# Altium footprint library YQPOWER.PcbLib: 215 footprints (part 12 of 14)
Each footprint in its own frame and in the unit in brackets; x right, y up, seen from the top. Pads: shape width x height; smd on the part's side, far side on the other; paste and mask are expansions set on the pad; w line width, h text height; cw(c..) or ccw(c..) is an arc to the next point about the centre after c.
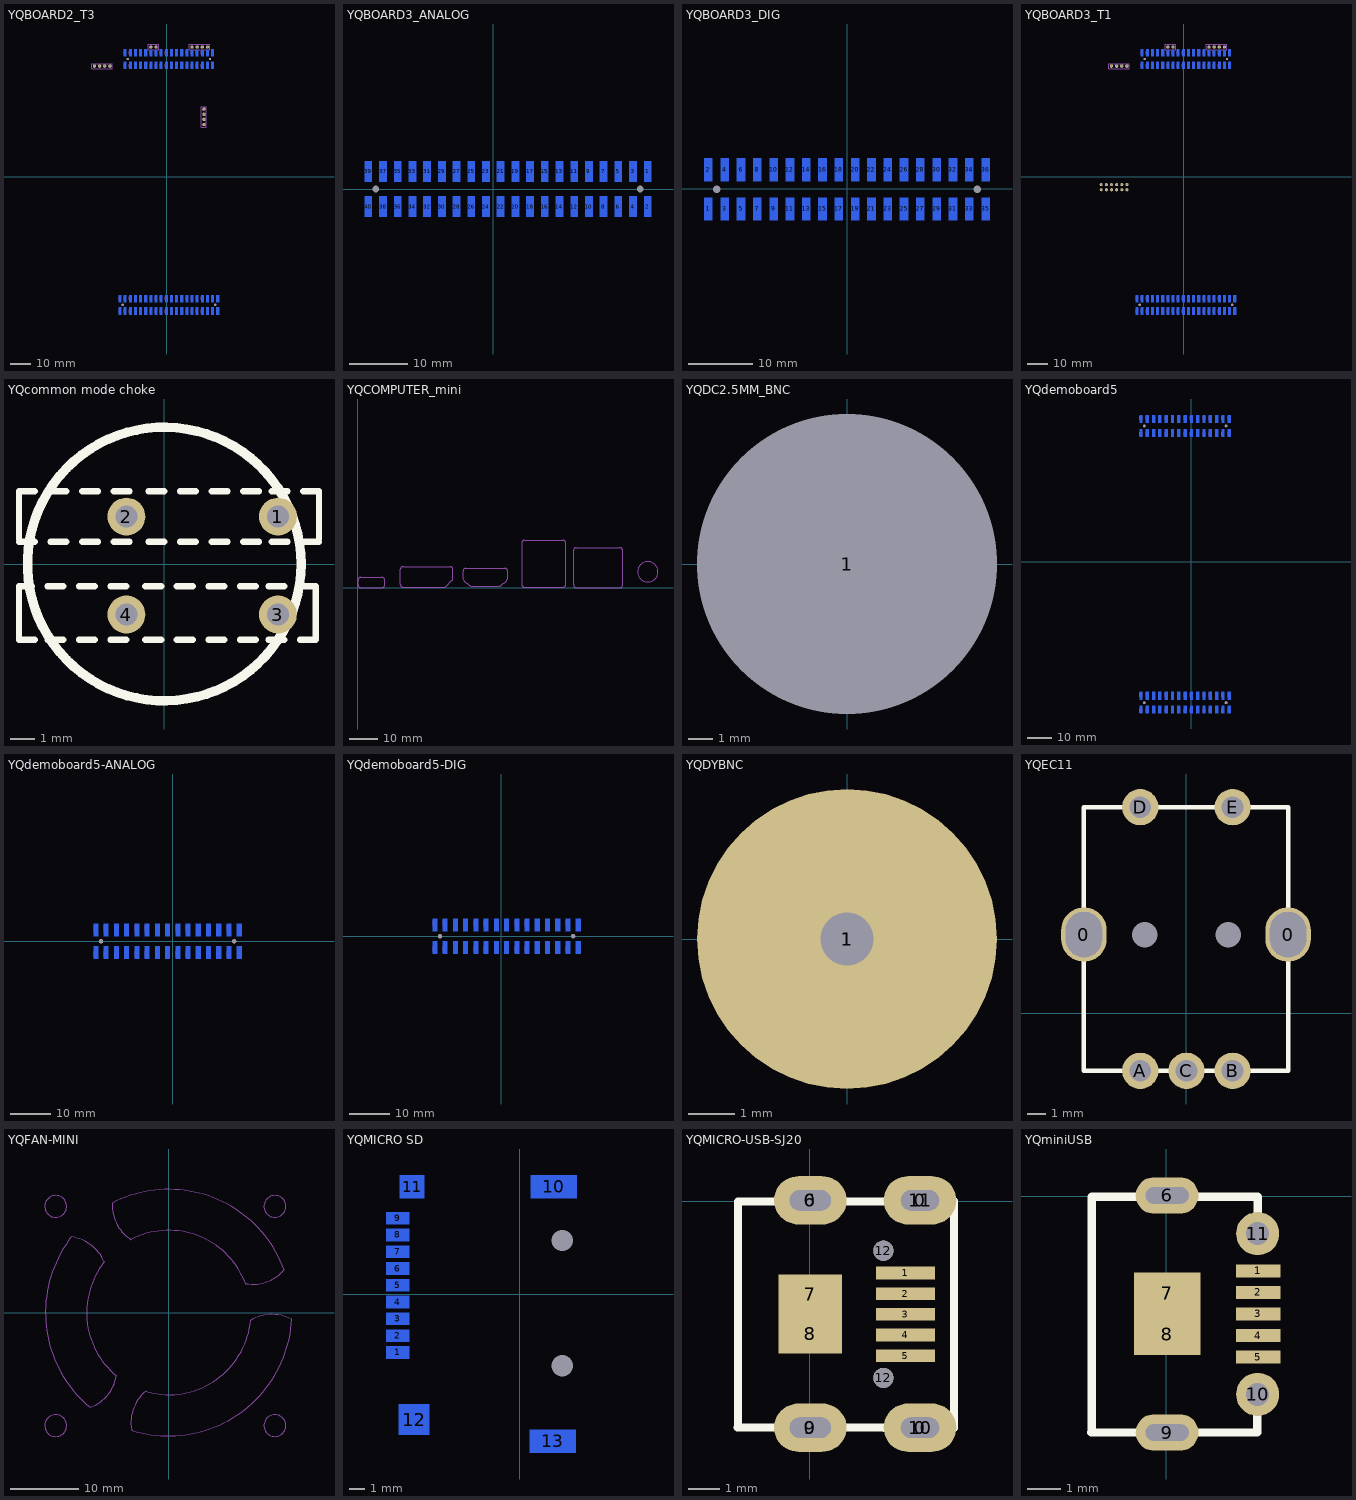
[diagram p11: the footprints below, top view; thin cyan lines are the x and y axes]

## YQBOARD2_T3 [mil]
pads (94):
  round 39.37 hole 45.28: 0(-855,-2495) 0(-755,2285) 0(845,2285) 0(945,-2495)
  rect 50x140 smd far side: 1(995,-2375) 2(995,-2615) 3(895,-2375) 4(895,-2615) 5(795,-2375) 6(795,-2615) 7(695,-2375) 8(695,-2615) 9(595,-2375) 10(595,-2615) 11(495,-2375) 12(495,-2615) 13(395,-2375) 14(395,-2615) 15(295,-2375) 16(295,-2615) 17(195,-2375) 18(195,-2615) 19(95,-2375) 20(95,-2615) 21(-5,-2375) 22(-5,-2615) 23(-105,-2375) 24(-105,-2615) 25(-205,-2375) 26(-205,-2615) 27(-305,-2375) 28(-305,-2615) 29(-405,-2375) 30(-405,-2615) 31(-505,-2375) 32(-505,-2615) 33(-605,-2375) 34(-605,-2615) 35(-705,-2375) 36(-705,-2615) 37(-805,-2375) 38(-805,-2615) 39(-905,-2375) 40(-905,-2615) 41(895,2405) 42(895,2165) 44(795,2165) 46(695,2165) 48(595,2165) 50(495,2165) 51(395,2405) 52(395,2165) 53(295,2405) 54(295,2165) 55(195,2405) 56(195,2165) 57(95,2405) 58(95,2165) 59(-5,2405) 60(-5,2165) 61(-105,2405) 62(-105,2165) 64(-205,2165) 66(-305,2165) 67(-405,2405) 68(-405,2165) 69(-505,2405) 70(-505,2165) 71(-605,2405) 72(-605,2165) 73(-705,2405) 74(-705,2165) 75(-805,2405) 76(-805,2165)
  rect 50x120 smd far side: 43(795,2395) 45(695,2395) 47(595,2395) 49(495,2395) 63(-205,2395) 65(-305,2395)
  round 64.96 hole 40 mask+0: 77(-1401.85,2147.91) 78(-1301.85,2147.91) 79(-1201.85,2147.91) 80(-1101.85,2147.91) 81(-304.8,2518.82) 82(-204.8,2518.82) 83(494.8,2517.99) 84(594.8,2517.99) 85(694.8,2517.99) 86(794.8,2517.99) 87(726.5,1011.69) 88(726.5,1111.69) 89(726.5,1211.69) 90(726.5,1311.69)
Bottom Overlay:
  region: 1061.5,-2318 1061.5,-2300 1028.5,-2300 1028.5,-2318
  lines w7: -1451.85,2097.91 -1051.85,2097.91 -1051.85,2197.91 -1451.85,2197.91 -1451.85,2097.91 ; -965,-2690 -965,-2300 1065,-2300 1065,-2690 -965,-2690 ; -875,2090 -875,2480 965,2480 965,2090 -875,2090 ; -354.8,2468.82 -354.8,2568.82 -154.8,2568.82 -154.8,2468.82 -354.8,2468.82 ; 444.8,2467.99 844.8,2467.99 844.8,2567.99 444.8,2567.99 444.8,2467.99 ; 676.5,961.69 676.5,1361.69 776.5,1361.69 776.5,961.69 676.5,961.69
  lines w10: -1723.31,-3003.66 -1723.31,2506.18 ; -1723.31,2507.16 cw(c-1623.31,2507.16) -1623.31,2607.16 ; -1722.91,-3001.1 ccw(c-1622.91,-3001.1) -1622.91,-3101.1 -1321.06,-3101.1 ; -1627.83,2607.56 1729.45,2607.56 ; -1123.98,-3100.87 -812.16,-3100.87 ; -615.31,-3100.87 -303.5,-3100.87 ; -106.65,-3100.87 205.16,-3100.87 ; 402.01,-3100.87 713.82,-3100.87 ; 910.67,-3100.87 1222.48,-3100.87 ; 1419.33,-3100.87 1719.84,-3100.87 ; 1720,-3100.71 ccw(c1720,-3000.71) 1820,-3000.71 ; 1730.96,2607.03 cw(c1730.96,2517.99) 1820,2517.99 1820,-3001.69
  lines w30: -1783.46,-2760.12 -1783.46,-3154.92 -1557.8,-3154.92 ; -1778.46,2280.12 -1778.46,2674.92 -1552.8,2674.92 ; 1647.8,-3159.92 1873.46,-3159.92 1873.46,-2765.12 ; 1652.8,2674.92 1878.46,2674.92 1878.46,2280.12
  text "1" at 1037,-2342 h40
  text "2" at 1030,-2615 h40
Mechanical 5:
  drawing of 244 lines, arcs and shapes, not listed
  text "1" at 1037,-2342 h40
  text "2" at 1025,-2617 h40

## YQBOARD3_ANALOG [mil]
pads (42):
  round 39.37 hole 45.28: 0(-800,0) 0(1000,0)
  rect 50x140 smd far side: 1(1050,120) 2(1050,-120) 3(950,120) 4(950,-120) 5(850,120) 6(850,-120) 7(750,120) 8(750,-120) 9(650,120) 10(650,-120) 11(550,120) 12(550,-120) 13(450,120) 14(450,-120) 15(350,120) 16(350,-120) 17(250,120) 18(250,-120) 19(150,120) 20(150,-120) 21(50,120) 22(50,-120) 23(-50,120) 24(-50,-120) 25(-150,120) 26(-150,-120) 27(-250,120) 28(-250,-120) 29(-350,120) 30(-350,-120) 31(-450,120) 32(-450,-120) 33(-550,120) 34(-550,-120) 35(-650,120) 36(-650,-120) 37(-750,120) 38(-750,-120) 39(-850,120) 40(-850,-120)
Bottom Overlay:
  region: 1116.5,177 1116.5,195 1083.5,195 1083.5,177
  lines w7: -910,-195 1120,-195 1120,195 -910,195 -910,-195
  text "2" at 1085,-120 h40
  text "1" at 1092,153 h40
Mechanical 5:
  lines w5: -866,-97.5 -866,-155 -834,-155 -834,-97.5 ; -866,97.5 -866,155 -834,155 -834,97.5 ; -766,-97.5 -766,-155 -734,-155 -734,-97.5 ; -766,97.5 -766,155 -734,155 -734,97.5 ; -666,-97.5 -666,-155 -634,-155 -634,-97.5 ; -666,97.5 -666,155 -634,155 -634,97.5 ; -566,-97.5 -566,-155 -534,-155 -534,-97.5 ; -566,97.5 -566,155 -534,155 -534,97.5 ; -466,-97.5 -466,-155 -434,-155 -434,-97.5 ; -466,97.5 -466,155 -434,155 -434,97.5 ; -366,-97.5 -366,-155 -334,-155 -334,-97.5 ; -366,97.5 -366,155 -334,155 -334,97.5 ; -266,-97.5 -266,-155 -234,-155 -234,-97.5 ; -266,97.5 -266,155 -234,155 -234,97.5 ; -166,-97.5 -166,-155 -134,-155 -134,-97.5 ; -166,97.5 -166,155 -134,155 -134,97.5 ; -66,-97.5 -66,-155 -34,-155 -34,-97.5 ; -66,97.5 -66,155 -34,155 -34,97.5 ; 34,-97.5 34,-155 66,-155 66,-97.5 ; 34,97.5 34,155 66,155 66,97.5 ; 134,-97.5 134,-155 166,-155 166,-97.5 ; 134,97.5 134,155 166,155 166,97.5 ; 234,-97.5 234,-155 266,-155 266,-97.5 ; 234,97.5 234,155 266,155 266,97.5 ; 334,-97.5 334,-155 366,-155 366,-97.5 ; 334,97.5 334,155 366,155 366,97.5 ; 434,-97.5 434,-155 466,-155 466,-97.5 ; 434,97.5 434,155 466,155 466,97.5 ; 534,-97.5 534,-155 566,-155 566,-97.5 ; 534,97.5 534,155 566,155 566,97.5 ; 634,-97.5 634,-155 666,-155 666,-97.5 ; 634,97.5 634,155 666,155 666,97.5 ; 734,-97.5 734,-155 766,-155 766,-97.5 ; 734,97.5 734,155 766,155 766,97.5 ; 834,-97.5 834,-155 866,-155 866,-97.5 ; 834,97.5 834,155 866,155 866,97.5 ; 934,-97.5 934,-155 966,-155 966,-97.5 ; 934,97.5 934,155 966,155 966,97.5 ; 1034,-97.5 1034,-155 1066,-155 1066,-97.5 ; 1034,97.5 1034,155 1066,155 1066,97.5
  text "2" at 1080,-122 h40
  text "1" at 1092,153 h40

## YQBOARD3_DIG [mil]
pads (38):
  round 39.37 hole 45.28: 0(-800,-5) 0(800,-5)
  rect 50x140 smd far side: 1(-850,-125) 2(-850,115) 3(-750,-125) 4(-750,115) 5(-650,-125) 6(-650,115) 7(-550,-125) 8(-550,115) 9(-450,-125) 10(-450,115) 11(-350,-125) 12(-350,115) 13(-250,-125) 14(-250,115) 15(-150,-125) 16(-150,115) 17(-50,-125) 18(-50,115) 19(50,-125) 20(50,115) 21(150,-125) 22(150,115) 23(250,-125) 24(250,115) 25(350,-125) 26(350,115) 27(450,-125) 28(450,115) 29(550,-125) 30(550,115) 31(650,-125) 32(650,115) 33(750,-125) 34(750,115) 35(850,-125) 36(850,115)
Bottom Overlay:
  lines w7: -920,190 -920,-200 920,-200 920,195
  lines w8: -920,190 -915,195 920,195
Mechanical 5:
  lines w5: -866,-102.5 -866,-160 -834,-160 -834,-102.5 ; -766,-102.5 -766,-160 -734,-160 -734,-102.5 ; -666,-102.5 -666,-160 -634,-160 -634,-102.5 ; -566,-102.5 -566,-160 -534,-160 -534,-102.5 ; -466,-102.5 -466,-160 -434,-160 -434,-102.5 ; -366,-102.5 -366,-160 -334,-160 -334,-102.5 ; -266,-102.5 -266,-160 -234,-160 -234,-102.5 ; -166,-102.5 -166,-160 -134,-160 -134,-102.5 ; -66,-102.5 -66,-160 -34,-160 -34,-102.5 ; 34,-102.5 34,-160 66,-160 66,-102.5 ; 134,-102.5 134,-160 166,-160 166,-102.5 ; 234,-102.5 234,-160 266,-160 266,-102.5 ; 334,-102.5 334,-160 366,-160 366,-102.5 ; 434,-102.5 434,-160 466,-160 466,-102.5 ; 534,-102.5 534,-160 566,-160 566,-102.5 ; 634,-102.5 634,-160 666,-160 666,-102.5 ; 734,-102.5 734,-160 766,-160 766,-102.5 ; 834,-102.5 834,-160 866,-160 866,-102.5

## YQBOARD3_T1 [mil]
pads (102):
  round 39.37 hole 45.28: 0(-855,-2495) 0(-755,2285) 0(845,2285) 0(945,-2495)
  rect 50x140 smd far side: 1(995,-2375) 2(995,-2615) 3(895,-2375) 4(895,-2615) 5(795,-2375) 6(795,-2615) 7(695,-2375) 8(695,-2615) 9(595,-2375) 10(595,-2615) 11(495,-2375) 12(495,-2615) 13(395,-2375) 14(395,-2615) 15(295,-2375) 16(295,-2615) 17(195,-2375) 18(195,-2615) 19(95,-2375) 20(95,-2615) 21(-5,-2375) 22(-5,-2615) 23(-105,-2375) 24(-105,-2615) 25(-205,-2375) 26(-205,-2615) 27(-305,-2375) 28(-305,-2615) 29(-405,-2375) 30(-405,-2615) 31(-505,-2375) 32(-505,-2615) 33(-605,-2375) 34(-605,-2615) 35(-705,-2375) 36(-705,-2615) 37(-805,-2375) 38(-805,-2615) 39(-905,-2375) 40(-905,-2615) 41(895,2405) 42(895,2165) 44(795,2165) 46(695,2165) 48(595,2165) 50(495,2165) 51(395,2405) 52(395,2165) 53(295,2405) 54(295,2165) 55(195,2405) 56(195,2165) 57(95,2405) 58(95,2165) 59(-5,2405) 60(-5,2165) 61(-105,2405) 62(-105,2165) 64(-205,2165) 66(-305,2165) 67(-405,2405) 68(-405,2165) 69(-505,2405) 70(-505,2165) 71(-605,2405) 72(-605,2165) 73(-705,2405) 74(-705,2165) 75(-805,2405) 76(-805,2165)
  rect 50x120 smd far side: 43(795,2395) 45(695,2395) 47(595,2395) 49(495,2395) 63(-205,2395) 65(-305,2395)
  round 64.96 hole 40 mask+0: 77(-1401.85,2147.91) 78(-1301.85,2147.91) 79(-1201.85,2147.91) 80(-1101.85,2147.91) 81(-304.8,2518.82) 82(-204.8,2518.82) 83(494.8,2517.99) 84(594.8,2517.99) 85(694.8,2517.99) 86(794.8,2517.99)
  round 59.06 hole 35.43: 91(-1601.26,-257.21) 92(-1501.26,-257.21) 93(-1401.26,-257.21) 94(-1301.26,-257.21) 95(-1201.26,-257.21) 96(-1101.26,-257.21) 97(-1101.26,-157.21) 98(-1201.26,-157.21) 99(-1301.26,-157.21) 100(-1401.26,-157.21) 101(-1501.26,-157.21) 102(-1601.26,-157.21)
Bottom Overlay:
  region: 1061.5,-2318 1061.5,-2300 1028.5,-2300 1028.5,-2318
  lines w7: -1451.85,2097.91 -1051.85,2097.91 -1051.85,2197.91 -1451.85,2197.91 -1451.85,2097.91 ; -965,-2690 -965,-2300 1065,-2300 1065,-2690 -965,-2690 ; -875,2090 -875,2480 965,2480 965,2090 -875,2090 ; -354.8,2468.82 -354.8,2568.82 -154.8,2568.82 -154.8,2468.82 -354.8,2468.82 ; 444.8,2467.99 844.8,2467.99 844.8,2567.99 444.8,2567.99 444.8,2467.99
  lines w7.87: -1651.26,-307.21 -1051.26,-307.21 -1051.26,-107.21 -1651.26,-107.21 -1651.26,-307.21
  lines w10: -1723.31,-3003.66 -1723.31,2506.18 ; -1723.31,2507.16 cw(c-1623.31,2507.16) -1623.31,2607.16 ; -1722.91,-3001.1 ccw(c-1622.91,-3001.1) -1622.91,-3101.1 -1321.06,-3101.1 ; -1627.83,2607.56 1729.45,2607.56 ; -1123.98,-3100.87 -812.16,-3100.87 ; -615.31,-3100.87 -303.5,-3100.87 ; -106.65,-3100.87 205.16,-3100.87 ; 402.01,-3100.87 713.82,-3100.87 ; 910.67,-3100.87 1222.48,-3100.87 ; 1419.33,-3100.87 1719.84,-3100.87 ; 1720,-3100.71 ccw(c1720,-3000.71) 1820,-3000.71 ; 1730.96,2607.03 cw(c1730.96,2517.99) 1820,2517.99 1820,-3001.69
  lines w30: -1783.46,-2760.12 -1783.46,-3154.92 -1557.8,-3154.92 ; -1778.46,2280.12 -1778.46,2674.92 -1552.8,2674.92 ; 1647.8,-3159.92 1873.46,-3159.92 1873.46,-2765.12 ; 1652.8,2674.92 1878.46,2674.92 1878.46,2280.12
  text "1" at 1037,-2342 h40
  text "2" at 1030,-2615 h40
Mechanical 5:
  drawing of 240 lines, arcs and shapes, not listed
  text "1" at 1037,-2342 h40
  text "2" at 1025,-2617 h40

## YQcommon mode choke [mil]
pads (4):
  round 60 hole 35: 1(180,75) 2(-60,75) 3(180,-80) 4(-60,-80)
Top Overlay:
  circle w15: c0,0 r216.54
  lines w10: -230,-70 -230,-45 ; -230,35 -205,35 ; -230,40 -230,115 ; -230,90 -230,115 ; -210,-35 -230,-35 -230,-120 -205,-120 ; -205,115 -230,115 ; -185,-120 -160,-120 ; -185,-35 -160,-35 ; -180,35 -155,35 ; -180,115 -155,115 ; -135,-120 -110,-120 ; -135,-35 -110,-35 ; -130,35 -105,35 ; -130,115 -105,115 ; -85,-120 -60,-120 ; -85,-35 -60,-35 ; -80,35 -55,35 ; -80,115 -55,115 ; -30,-120 -5,-120 ; -30,-35 -5,-35 ; -25,35 0,35 ; -25,115 0,115 ; 20,-120 45,-120 ; 20,-35 45,-35 ; 25,35 50,35 ; 25,115 50,115 ; 70,-120 95,-120 ; 70,-35 95,-35 ; 75,35 100,35 ; 75,115 100,115 ; 120,-120 145,-120 ; 120,-35 145,-35 ; 125,35 150,35 ; 125,115 150,115 ; 165,-120 190,-120 ; 165,-35 190,-35 ; 170,35 195,35 ; 170,115 195,115 ; 215,-120 240,-120 240,-35 215,-35 ; 220,35 245,35 ; 220,115 245,115 245,40 245,65 ; 240,-110 240,-85

## YQCOMPUTER_mini [mm]
Mechanical 1:
  lines w0.1: 0.006,2.7 cw(c1.006,2.7) 1.01,3.7 8.412,3.7 cw(c8.415,2.7) 9.415,2.7 9.415,1 cw(c8.415,1) 8.412,0 1.01,0 ; 0.01,2.709 0.01,1.008 ccw(c1.01,1.005) 1.01,0.005 ; 33.483,3.311 cw(c32.483,3.307) 33.18,2.59 31.08,0.49 cw(c30.376,1.2) 30.376,0.2 15.98,0.2 cw(c15.976,1.2) 14.976,1.2 14.976,6.5 cw(c15.976,6.5) 15.98,7.5 32.48,7.5 cw(c32.484,6.5) 33.484,6.5 33.484,3.3 ; 37.076,5.9 cw(c38.076,5.9) 38.08,6.9 51.78,6.9 cw(c51.784,5.9) 52.784,5.9 ; 37.08,5.9 37.08,3.19 ccw(c39.478,3.897) 38.59,1.56 39.268,0.892 ; 39.266,0.89 ccw(c39.97,1.6) 39.97,0.6 49.89,0.6 ; 49.89,0.6 ccw(c49.89,1.6) 50.594,0.891 ; 50.592,0.893 51.27,1.56 ccw(c50.382,3.898) 52.78,3.19 52.78,5.9 ; 100.848,2.351 cw(c102.281,5.653) 100.85,2.35 ; 57.79,1.21 ccw(c58.79,1.206) 58.79,0.206 72.29,0.206 ccw(c72.29,1.206) 73.29,1.21 73.29,15.81 ccw(c72.29,15.814) 72.29,16.814 58.79,16.814 ccw(c58.79,15.814) 57.79,15.81 57.79,1.21 ; 76.08,1 ccw(c77.08,0.996) 77.08,-0.004 92.38,-0.004 ccw(c92.38,0.996) 93.38,1 93.38,13.2 ccw(c92.38,13.204) 92.38,14.204 77.08,14.204 ccw(c77.08,13.204) 76.08,13.2 76.08,1

## YQDC2.5MM_BNC [mm] "5mm high,5mm D,1mm hole"
pads (1):
  round 2 hole 12.5: 1(0,0)

## YQdemoboard5 [mil]
pads (64):
  round 39.37 hole 43.31: 0(-745,-2240) 0(-745,2150) 0(555,-2240) 0(555,2150)
  rect 45x120 smd far side: 1(605,-2350) 2(605,-2130) 3(505,-2350) 4(505,-2130) 5(405,-2350) 6(405,-2130) 7(305,-2350) 8(305,-2130) 9(205,-2350) 10(205,-2130) 11(105,-2350) 12(105,-2130) 13(5,-2350) 14(5,-2130) 15(-95,-2350) 16(-95,-2130) 17(-195,-2350) 18(-195,-2130) 19(-295,-2350) 20(-295,-2130) 21(-395,-2350) 22(-395,-2130) 23(-495,-2350) 24(-495,-2130) 25(-595,-2350) 26(-595,-2130) 27(-695,-2350) 28(-695,-2130) 29(-795,-2350) 30(-795,-2130) 31(605,2040) 32(605,2260) 33(505,2040) 34(505,2260) 35(405,2040) 36(405,2260) 37(305,2040) 38(305,2260) 39(205,2040) 40(205,2260) 41(105,2040) 42(105,2260) 43(5,2040) 44(5,2260) 45(-95,2040) 46(-95,2260) 47(-195,2040) 48(-195,2260) 49(-295,2040) 50(-295,2260) 51(-395,2040) 52(-395,2260) 53(-495,2040) 54(-495,2260) 55(-595,2040) 56(-595,2260) 57(-695,2040) 58(-695,2260) 59(-795,2040) 60(-795,2260)
Bottom Overlay:
  region: 673,-2080 673,-2062 640,-2062 640,-2080
  region: 673,2310 673,2328 640,2328 640,2310
  lines w7: -865,-2418 -865,-2062 -363,-2062 -362,-2061 673,-2061 673,-2419 -362,-2419 -363,-2418 -865,-2418 ; -865,1972 -865,2328 -363,2328 -362,2329 673,2329 673,1971 -362,1971 -363,1972 -865,1972
  lines w10: -1209.35,2142.44 -1209.98,2143.07 -1254.62,2143.07 -1254.62,2339.92 -1253.99,2339.29 -974.62,2339.29 -974.62,2142.44 -1018.4,2142.44
  lines w30: -1545.67,-2014.88 -1545.67,-2410.55 -1312.2,-2410.55 ; -1545.67,1915.12 -1545.67,2309.92 -1180,2310 ; 905,-2415 1375,-2415 ; 1157.8,2309.92 1383.46,2309.92 1383.46,1915.12 ; 1383.46,-2410.55 1383.46,-2014.88
  text "1" at 647,-2087 h40
  text "2" at 635,-2362 h40
  text "1" at 647,2303 h40
  text "2" at 635,2028 h40
Mechanical 5:
  drawing of 180 lines, arcs and shapes, not listed
  text "1" at 647,-2087 h40
  text "2" at 635,-2362 h40
  text "1" at 647,2303 h40
  text "2" at 635,2028 h40

## YQdemoboard5-ANALOG [mil]
pads (32):
  round 39.37 hole 43.31: 0(-700,0) 0(600,0)
  rect 45x120 smd far side: 1(650,-110) 2(650,110) 3(550,-110) 4(550,110) 5(450,-110) 6(450,110) 7(350,-110) 8(350,110) 9(250,-110) 10(250,110) 11(150,-110) 12(150,110) 13(50,-110) 14(50,110) 15(-50,-110) 16(-50,110) 17(-150,-110) 18(-150,110) 19(-250,-110) 20(-250,110) 21(-350,-110) 22(-350,110) 23(-450,-110) 24(-450,110) 25(-550,-110) 26(-550,110) 27(-650,-110) 28(-650,110) 29(-750,-110) 30(-750,110)
Bottom Overlay:
  region: 718,160 718,178 685,178 685,160
  lines w7: -820,-178 -820,178 -318,178 -317,179 718,179 718,-179 -317,-179 -318,-178 -820,-178
  lines w30: -1500.67,225.12 -1500.67,-170.55 -1267.2,-170.55 ; 950,-175 1420,-175 ; 1428.46,-170.55 1428.46,225.12
  text "1" at 692,153 h40
  text "2" at 680,-122 h40
Mechanical 5:
  lines w5: -766,-97.5 -766,-155 -734,-155 -734,-97.5 ; -766,97.5 -766,155 -734,155 -734,97.5 ; -666,-97.5 -666,-155 -634,-155 -634,-97.5 ; -666,97.5 -666,155 -634,155 -634,97.5 ; -566,-97.5 -566,-155 -534,-155 -534,-97.5 ; -566,97.5 -566,155 -534,155 -534,97.5 ; -466,-97.5 -466,-155 -434,-155 -434,-97.5 ; -466,97.5 -466,155 -434,155 -434,97.5 ; -366,-97.5 -366,-155 -334,-155 -334,-97.5 ; -366,97.5 -366,155 -334,155 -334,97.5 ; -266,-97.5 -266,-155 -234,-155 -234,-97.5 ; -266,97.5 -266,155 -234,155 -234,97.5 ; -166,-97.5 -166,-155 -134,-155 -134,-97.5 ; -166,97.5 -166,155 -134,155 -134,97.5 ; -66,-97.5 -66,-155 -34,-155 -34,-97.5 ; -66,97.5 -66,155 -34,155 -34,97.5 ; 34,-97.5 34,-155 66,-155 66,-97.5 ; 34,97.5 34,155 66,155 66,97.5 ; 134,-97.5 134,-155 166,-155 166,-97.5 ; 134,97.5 134,155 166,155 166,97.5 ; 234,-97.5 234,-155 266,-155 266,-97.5 ; 234,97.5 234,155 266,155 266,97.5 ; 334,-97.5 334,-155 366,-155 366,-97.5 ; 334,97.5 334,155 366,155 366,97.5 ; 434,-97.5 434,-155 466,-155 466,-97.5 ; 434,97.5 434,155 466,155 466,97.5 ; 534,-97.5 534,-155 566,-155 566,-97.5 ; 534,97.5 534,155 566,155 566,97.5 ; 634,-97.5 634,-155 666,-155 666,-97.5 ; 634,97.5 634,155 666,155 666,97.5
  text "1" at 692,153 h40
  text "2" at 680,-122 h40

## YQdemoboard5-DIG [mil]
pads (32):
  round 39.37 hole 43.31: 0(-600,0) 0(700,0)
  rect 45x120 smd far side: 31(750,-110) 32(750,110) 33(650,-110) 34(650,110) 35(550,-110) 36(550,110) 37(450,-110) 38(450,110) 39(350,-110) 40(350,110) 41(250,-110) 42(250,110) 43(150,-110) 44(150,110) 45(50,-110) 46(50,110) 47(-50,-110) 48(-50,110) 49(-150,-110) 50(-150,110) 51(-250,-110) 52(-250,110) 53(-350,-110) 54(-350,110) 55(-450,-110) 56(-450,110) 57(-550,-110) 58(-550,110) 59(-650,-110) 60(-650,110)
Bottom Overlay:
  region: 818,160 818,178 785,178 785,160
  lines w7: -720,-178 -218,-178 -217,-179 818,-179 818,179 -217,179 -218,178 -720,178 -720,-178
  lines w30: -1400.67,-234.88 -1400.67,159.92 -1035,160 ; 1302.8,159.92 1528.46,159.92 1528.46,-234.88
  text "2" at 780,-122 h40
  text "1" at 792,153 h40
Mechanical 5:
  lines w5: -666,-97.5 -666,-155 -634,-155 -634,-97.5 ; -666,97.5 -666,155 -634,155 -634,97.5 ; -566,-97.5 -566,-155 -534,-155 -534,-97.5 ; -566,97.5 -566,155 -534,155 -534,97.5 ; -466,-97.5 -466,-155 -434,-155 -434,-97.5 ; -466,97.5 -466,155 -434,155 -434,97.5 ; -366,-97.5 -366,-155 -334,-155 -334,-97.5 ; -366,97.5 -366,155 -334,155 -334,97.5 ; -266,-97.5 -266,-155 -234,-155 -234,-97.5 ; -266,97.5 -266,155 -234,155 -234,97.5 ; -166,-97.5 -166,-155 -134,-155 -134,-97.5 ; -166,97.5 -166,155 -134,155 -134,97.5 ; -66,-97.5 -66,-155 -34,-155 -34,-97.5 ; -66,97.5 -66,155 -34,155 -34,97.5 ; 34,-97.5 34,-155 66,-155 66,-97.5 ; 34,97.5 34,155 66,155 66,97.5 ; 134,-97.5 134,-155 166,-155 166,-97.5 ; 134,97.5 134,155 166,155 166,97.5 ; 234,-97.5 234,-155 266,-155 266,-97.5 ; 234,97.5 234,155 266,155 266,97.5 ; 334,-97.5 334,-155 366,-155 366,-97.5 ; 334,97.5 334,155 366,155 366,97.5 ; 434,-97.5 434,-155 466,-155 466,-97.5 ; 434,97.5 434,155 466,155 466,97.5 ; 534,-97.5 534,-155 566,-155 566,-97.5 ; 534,97.5 534,155 566,155 566,97.5 ; 634,-97.5 634,-155 666,-155 666,-97.5 ; 634,97.5 634,155 666,155 666,97.5 ; 734,-97.5 734,-155 766,-155 766,-97.5 ; 734,97.5 734,155 766,155 766,97.5
  text "2" at 780,-122 h40
  text "1" at 792,153 h40

## YQDYBNC [mm] "5mm high,5mm D,1mm hole"
pads (2):
  round 2 hole 1.15: 1(0,0)
  round 6.5 smd: 1(0,0)

## YQEC11 [mm]
pads (9):
  oval 2.5x3 hole 2 slot 2.5 at 90 deg: 0(-5.639,4.318) 0(5.588,4.318)
  round 0 hole 1.4: 0(-2.286,4.318) 0(2.286,4.318)
  round 2 hole 1.2: A(-2.54,-3.175) B(2.54,-3.175) C(0,-3.175) D(-2.54,11.325) E(2.54,11.325)
Top Overlay:
  lines w0.254: -5.639,-3.175 5.588,-3.175 5.588,11.325 -5.639,11.325 -5.639,-3.175

## YQFAN-MINI [mm]
Mechanical 1:
  lines w0.1: -15,-15.943 ccw(c-16.5,-16.5) -14.996,-15.955 ; -15,16.057 ccw(c-16.5,15.5) -14.996,16.045 ; -14.22,11.05 cw(c-14.985,5.099) -9.436,7.382 ; -14.218,11.049 ccw(c0,0.01) -11.482,-13.852 ; -11.465,-13.854 ccw(c-13.56,-8.231) -7.649,-9.261 ; -9.439,7.387 ccw(c0.01,-0.01) -7.638,-9.257 ; -8.255,15.985 cw(c0,-0.01) 16.873,6.259 ; -8.25,15.99 ccw(c-2.257,15.693) -5.516,10.655 ; -5.524,10.668 cw(c-0.01,0.01) 11.223,4.23 ; -5.435,-17.161 cw(c0.472,-16.107) -3.382,-11.508 ; -5.428,-17.165 ccw(c-0.01,0) 17.962,-1.01 ; -3.379,-11.502 ccw(c0.01,0.01) 11.955,-1.138 ; 11.22,4.24 ccw(c12.314,10.139) 16.882,6.249 ; 11.95,-1.13 cw(c15.061,-6.26) 17.955,-1.004 ; 17,-15.943 ccw(c15.5,-16.5) 17.004,-15.955 ; 17,16.057 ccw(c15.5,15.5) 17.004,16.045

## YQMICRO SD [mm]
pads (15):
  round 0 hole 1.4 mask+0: 0(2.794,-4.669) 0(2.794,3.531)
  rect 1.5x0.8 smd far side: 1(-7.982,-3.805) 2(-7.982,-2.705) 3(-7.982,-1.605) 4(-7.982,-0.505) 5(-7.982,0.595) 6(-7.982,1.695) 7(-7.982,2.795) 8(-7.982,3.895) 9(-7.982,4.995)
  rect 3x1.5 smd far side: 10(2.234,7.043) 13(2.18,-9.612)
  rect 1.6x1.5 smd far side: 11(-7.037,7.043)
  rect 2x2 smd far side: 12(-6.91,-8.197)
Bottom Overlay:
  lines w0.254: 7.21,-8.651 7.21,6.027 -6.91,6.027 -6.91,-6.8 -5.005,-6.8 -5.005,-8.578 7.21,-8.578

## YQMICRO-USB-SJ20 [mil] "MICRO-USB-SJ20"
pads (17):
  oval 90x60 on Top Paste: 0(1,-280.5) 0(1,1) 0(136.81,-280.5) 0(136.81,1)
  rect 72.83x15.75 smd: 1(118.72,-88.96) 2(118.72,-114.55) 3(118.72,-140.14) 4(118.72,-165.73) 5(118.72,-191.32)
  oval 90x60 hole 25.59 slot 51.18 at 0 deg: 6(1,1) 9(1,-280.5)
  rect 78.74x49.21 smd: 7(1,-115.14) 8(1,-164)
  oval 90x60 hole 25.59 slot 47.24 at 0 deg: 10(136.81,-280.5) 11(136.81,1)
  round 25 hole 25: 12(91.54,-218.9) 12(91.54,-61.42)
Top Overlay:
  lines w10: 92.91,-281.1 178.74,-281.1 178.74,0 100.79,0 ; 107.85,-280.5 -89,-280.5 -88.37,-279.87 -88.37,-0.5 108.48,-0.5

## YQminiUSB [mm]
pads (11):
  rect 1.35x0.4 smd: 1(2.775,-2.25) 2(2.775,-2.9) 3(2.775,-3.55) 4(2.775,-4.2) 5(2.775,-4.85)
  oval 1.9x1.1 hole 0.5 slot 1.3 at 0 deg: 6(0.025,0.025) 9(0.025,-7.125)
  rect 2x1.25 smd: 7(0.025,-2.925) 8(0.025,-4.166)
  round 1.3 hole 0.7: 10(2.755,-5.975) 11(2.755,-1.125)
Top Overlay:
  lines w0.254: 2.755,-5.975 2.739,-5.991 2.739,-7.125 -2.261,-7.125 -2.245,-7.109 -2.245,-0.013 2.755,-0.013 2.755,-1.125